# Altium footprint library IC_SMD_QUAD.PCBLIB: 114 footprints (part 8 of 8)
Each footprint in its own frame and in the unit in brackets; x right, y up, seen from the top. Pads: shape width x height; smd on the part's side, far side on the other; paste and mask are expansions set on the pad; w line width, h text height; cw(c..) or ccw(c..) is an arc to the next point about the centre after c.
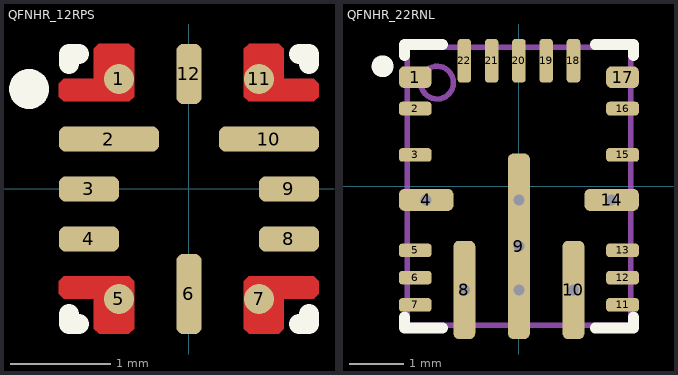
[diagram p7: the footprints below, top view; thin cyan lines are the x and y axes]

## QFNHR_12RPS [mm] "VQFN-HR RPS, 2.2X2.5X1mm"
height 1
pads (12):
  round 0.3 smd paste+0 mask+0: 1(-0.7,1.1) 5(-0.7,-1.1) 7(0.7,-1.1) 11(0.7,1.1)
  rrect50% 1x0.25 smd paste+0 mask+0.05: 2(-0.8,0.5) 10(0.8,0.5)
  rrect50% 0.6x0.25 smd paste+0 mask+0.05: 3(-1,0) 4(-1,-0.5) 8(1,-0.5) 9(1,0)
  rrect50% 0.25x0.8 smd paste+0 mask+0.05: 6(0,-1.05)
  rrect50% 0.25x0.6 smd paste+0 mask+0.05: 12(0,1.15)
TopLayer:
  region: 1.3,1.05 1.25,1.1 0.95,1.1 0.95,1.4 0.9,1.45 0.6,1.45 0.55,1.4 0.55,0.925 0.6,0.875 1.25,0.875 1.3,0.925
  region: 1.3,-1.05 1.25,-1.1 0.95,-1.1 0.95,-1.4 0.9,-1.45 0.6,-1.45 0.55,-1.4 0.55,-0.925 0.6,-0.875 1.25,-0.875 1.3,-0.925
  region: -1.3,-1.05 -1.25,-1.1 -0.95,-1.1 -0.95,-1.4 -0.9,-1.45 -0.6,-1.45 -0.55,-1.4 -0.55,-0.925 -0.6,-0.875 -1.25,-0.875 -1.3,-0.925
  region: -1.3,1.05 -1.25,1.1 -0.95,1.1 -0.95,1.4 -0.9,1.45 -0.6,1.45 -0.55,1.4 -0.55,0.925 -0.6,0.875 -1.25,0.875 -1.3,0.925
TopOverlay:
  circle w0.2: c-1.6,1 r0.1
  lines w0.2: -1.2,-1.25 -1.2,-1.35 -1.1,-1.35 ; -1.2,1.25 -1.2,1.35 -1.1,1.35 ; 1.1,-1.35 1.2,-1.35 1.2,-1.25 ; 1.1,1.35 1.2,1.35 1.2,1.25
3D body "RPS0012A.stp": height 1, standoff 0, extent -1.1,-1.25 1.1,1.25

## QFNHR_22RNL [mm] "VQFN-HR22, RNL, 5X4X0.9mm"
height 0.9
pads (22):
  rrect50% 0.6x0.4 smd paste+0 mask+0.075: 1(-1.9,2) 17(1.9,2)
  rrect50% 0.6x0.25 smd paste+0 mask+0.075: 2(-1.9,1.425) 3(-1.9,0.575) 5(-1.9,-1.175) 6(-1.9,-1.675) 7(-1.9,-2.175) 11(1.9,-2.175) 12(1.9,-1.675) 13(1.9,-1.175) 15(1.9,0.575) 16(1.9,1.425)
  rrect50% 1x0.4 smd paste-0.5 mask+0.075: 4(-1.7,-0.25) 14(1.7,-0.25)
  rrect50% 0.4x1.8 smd paste-0.812 mask+0.075: 8(-1,-1.9) 10(1,-1.9)
  rrect50% 0.4x3.4 smd paste-1.562 mask+0.075: 9(0,-1.1)
  rrect50% 0.25x0.8 smd paste+0 mask+0.075: 18(1,2.3) 19(0.5,2.3) 20(0,2.3) 21(-0.5,2.3) 22(-1,2.3)
via 1.7,-0.25 diameter 0.4 hole 0.2
via -1.7,-0.25 diameter 0.4 hole 0.2
via -1,-1.9 diameter 0.4 hole 0.2
via 1,-1.9 diameter 0.4 hole 0.2
via 0,-1.9 diameter 0.4 hole 0.2
via 0,-0.25 diameter 0.4 hole 0.2
via 0,-1.1 diameter 0.4 hole 0.2
TopOverlay:
  circle w0.2: c-2.5,2.2 r0.1
  lines w0.2: -2.1,-2.4 -2.1,-2.6 -1.4,-2.6 ; -2.1,2.4 -2.1,2.6 -1.4,2.6 ; 1.4,-2.6 2.1,-2.6 2.1,-2.4 ; 1.4,2.6 2.1,2.6 2.1,2.4
TopPaste:
  drawing of 12 lines, arcs and shapes, not listed
Mechanical13:
  circle w0.1: c-1.5,1.9 r0.3
  lines w0.1: -2.05,-2.55 -2.05,2.55 2.05,2.55 2.05,-2.55 -2.05,-2.55
3D body: height 0.25, standoff 0, extent 0,0 0.254,0.254
3D body "RNL0022A.stp": height 0.9, standoff 0, extent -2,-2.5 2,2.5